# Altium footprint library IC.PCBLIB: 359 footprints (part 16 of 23)
Each footprint in its own frame and in the unit in brackets; x right, y up, seen from the top. Pads: shape width x height; smd on the part's side, far side on the other; paste and mask are expansions set on the pad; w line width, h text height; cw(c..) or ccw(c..) is an arc to the next point about the centre after c.
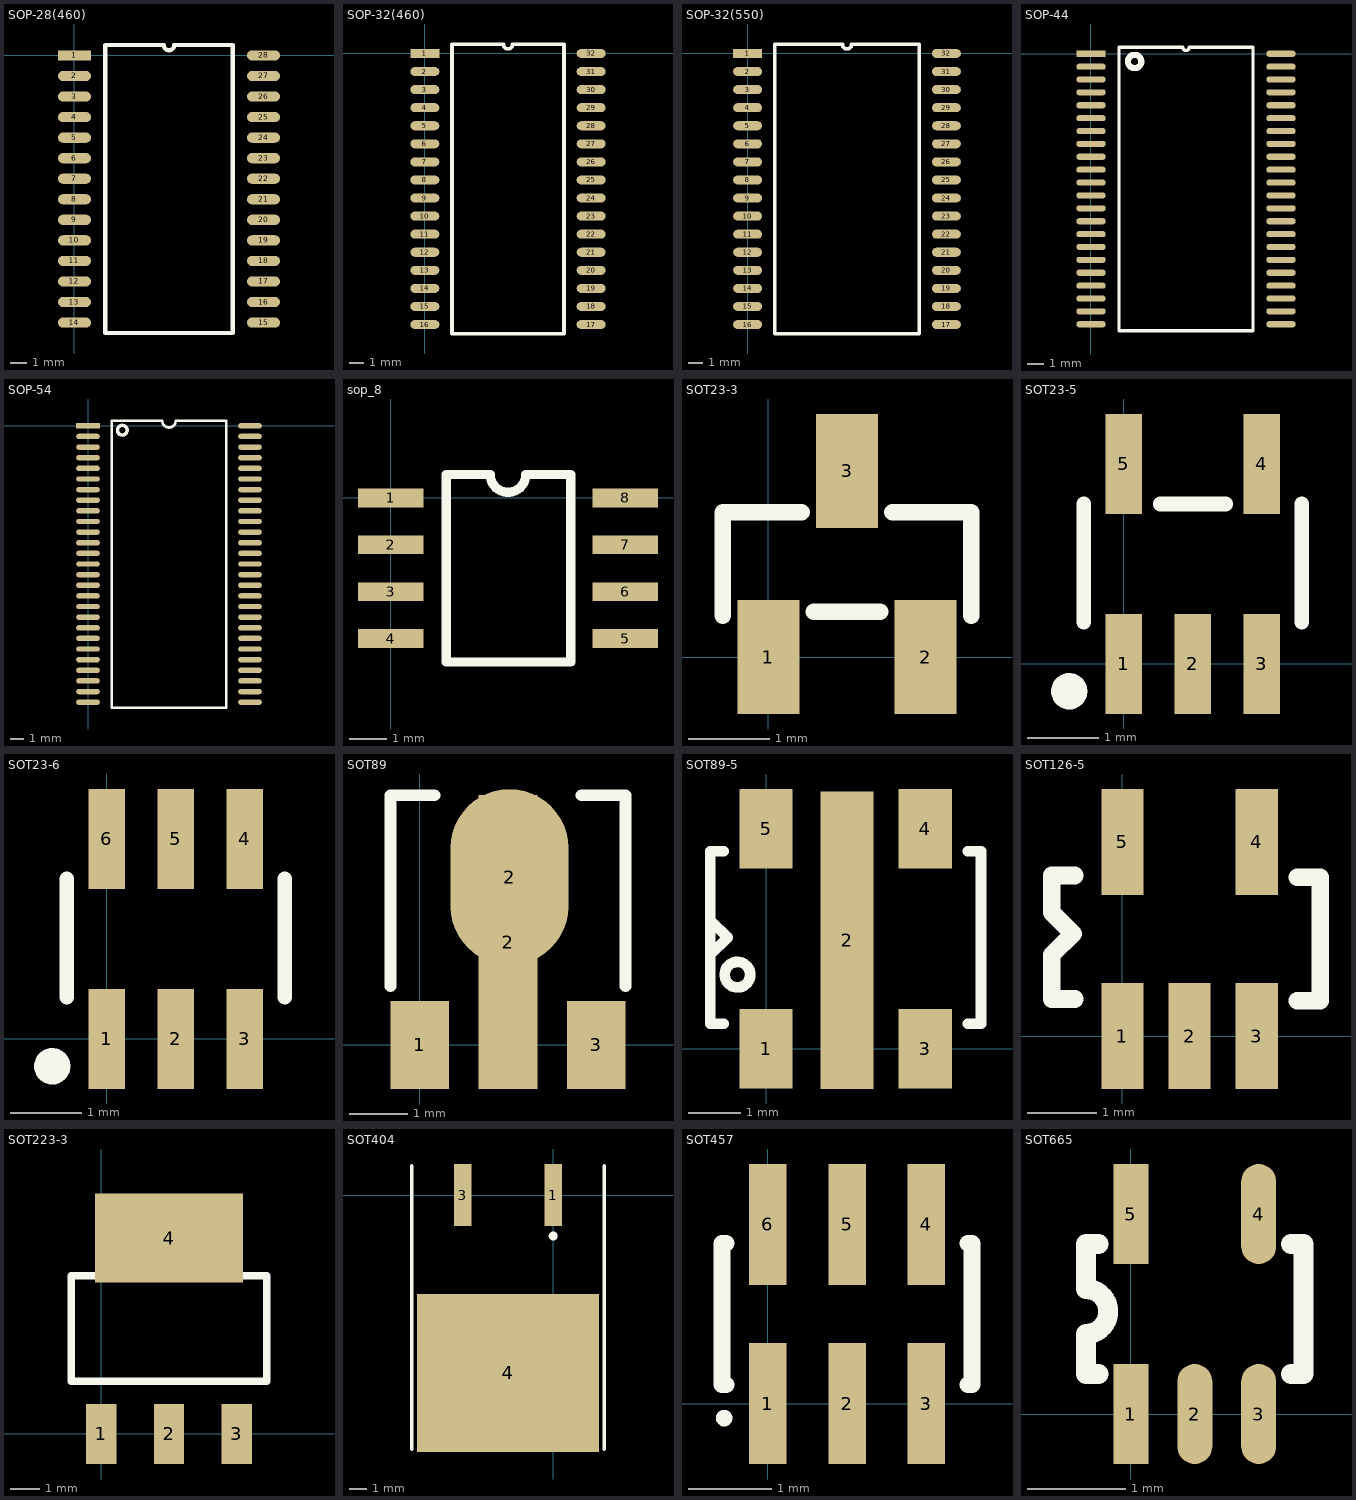
[diagram p15: the footprints below, top view; thin cyan lines are the x and y axes]

## SOP-28(460) [mil]
pads (28):
  rect 80x25 smd: 1(0,0)
  oval 80x25 smd: 2(0,-50) 3(0,-100) 4(0,-150) 5(0,-200) 6(0,-250) 7(0,-300) 8(0,-350) 9(0,-400) 10(0,-450) 11(0,-500) 12(0,-550) 13(0,-600) 14(0,-650) 15(460,-650) 16(460,-600) 17(460,-550) 18(460,-500) 19(460,-450) 20(460,-400) 21(460,-350) 22(460,-300) 23(460,-250) 24(460,-200) 25(460,-150) 26(460,-100) 27(460,-50) 28(460,0)
TopOverlay:
  lines w10: 75,-675 75,25 217.5,25 ccw(c230,25) 242.5,25 385,25 385,-675 75,-675

## SOP-32(460) [mil]
pads (32):
  rect 80x25 smd: 1(0,0)
  oval 80x25 smd: 2(0,-50) 3(0,-100) 4(0,-150) 5(0,-200) 6(0,-250) 7(0,-300) 8(0,-350) 9(0,-400) 10(0,-450) 11(0,-500) 12(0,-550) 13(0,-600) 14(0,-650) 15(0,-700) 16(0,-750) 17(460,-750) 18(460,-700) 19(460,-650) 20(460,-600) 21(460,-550) 22(460,-500) 23(460,-450) 24(460,-400) 25(460,-350) 26(460,-300) 27(460,-250) 28(460,-200) 29(460,-150) 30(460,-100) 31(460,-50) 32(460,0)
TopOverlay:
  lines w10: 75,-775 385,-775 385,25 242.5,25 cw(c230,25) 217.5,25 75,25 75,-775

## SOP-32(550) [mil]
pads (32):
  rect 80x25 smd: 1(0,0)
  oval 80x25 smd: 2(0,-50) 3(0,-100) 4(0,-150) 5(0,-200) 6(0,-250) 7(0,-300) 8(0,-350) 9(0,-400) 10(0,-450) 11(0,-500) 12(0,-550) 13(0,-600) 14(0,-650) 15(0,-700) 16(0,-750) 17(550,-750) 18(550,-700) 19(550,-650) 20(550,-600) 21(550,-550) 22(550,-500) 23(550,-450) 24(550,-400) 25(550,-350) 26(550,-300) 27(550,-250) 28(550,-200) 29(550,-150) 30(550,-100) 31(550,-50) 32(550,0)
TopOverlay:
  lines w10: 75,-775 475,-775 475,25 287.5,25 cw(c275,25) 262.5,25 75,25 75,-775

## SOP-44 [mil]
pads (44):
  rect 72x15 smd: 1(0,0)
  oval 72x15 smd: 2(0,-31.5) 3(0,-62.99) 4(0,-94.49) 5(0,-125.98) 6(0,-157.48) 7(0,-188.98) 8(0,-220.47) 9(0,-251.97) 10(0,-283.46) 11(0,-314.96) 12(0,-346.46) 13(0,-377.95) 14(0,-409.45) 15(0,-440.94) 16(0,-472.44) 17(0,-503.94) 18(0,-535.43) 19(0,-566.93) 20(0,-598.43) 21(0,-629.92) 22(0,-661.42) 23(464.57,-661.42) 24(464.57,-629.92) 25(464.57,-598.43) 26(464.57,-566.93) 27(464.57,-535.43) 28(464.57,-503.94) 29(464.57,-472.44) 30(464.57,-440.94) 31(464.57,-409.45) 32(464.57,-377.95) 33(464.57,-346.46) 34(464.57,-314.96) 35(464.57,-283.46) 36(464.57,-251.97) 37(464.57,-220.47) 38(464.57,-188.98) 39(464.57,-157.48) 40(464.57,-125.98) 41(464.57,-94.49) 42(464.57,-62.99) 43(464.57,-31.5) 44(464.57,0)
TopOverlay:
  lines w7.87: 68.31,-677.17 396.26,-677.17 396.26,15.75 240.16,15.75 cw(c232.28,15.75) 224.41,15.75 68.31,15.75 68.31,-677.17
  lines w15: 123,-19 cw(c106.69,-19) 122.99,-18.32

## SOP-54 [mil]
pads (54):
  rect 70x16 smd: 1(0,0)
  oval 70x16 smd: 2(0,-31.5) 3(0,-62.99) 4(0,-94.49) 5(0,-125.98) 6(0,-157.48) 7(0,-188.98) 8(0,-220.47) 9(0,-251.97) 10(0,-283.46) 11(0,-314.96) 12(0,-346.46) 13(0,-377.95) 14(0,-409.45) 15(0,-440.94) 16(0,-472.44) 17(0,-503.94) 18(0,-535.43) 19(0,-566.93) 20(0,-598.43) 21(0,-629.92) 22(0,-661.42) 23(0,-692.91) 24(0,-724.41) 25(0,-755.91) 26(0,-787.4) 27(0,-818.9) 28(479.94,-818.9) 29(479.94,-787.4) 30(479.94,-755.91) 31(479.94,-724.41) 32(479.94,-692.91) 33(479.94,-661.42) 34(479.94,-629.92) 35(479.94,-598.43) 36(479.94,-566.93) 37(479.94,-535.43) 38(479.94,-503.94) 39(479.94,-472.44) 40(479.94,-440.94) 41(479.94,-409.45) 42(479.94,-377.95) 43(479.94,-346.46) 44(479.94,-314.96) 45(479.94,-283.46) 46(479.94,-251.97) 47(479.94,-220.47) 48(479.94,-188.98) 49(479.94,-157.48) 50(479.94,-125.98) 51(479.94,-94.49) 52(479.94,-62.99) 53(479.94,-31.5) 54(479.94,0)
TopOverlay:
  circle w10: c101.58,-13 r14.42
  lines w7.87: 70,-835 410,-835 ; 70,15 220,15 ccw(c240,15) 260,15 410,15
  lines w8: 70,-835 70,15 ; 410,-835 410,15

## sop_8 [mil]
pads (8):
  rect 70x20 smd: 1(0,0) 2(0,-50) 3(0,-100) 4(0,-150) 5(250,-150) 6(250,-100) 7(250,-50) 8(250,0)
TopOverlay:
  lines w10: 144,25 cw(c125,25) 106,25 59,25 59,-175 192,-175 192,25 145,25
3D body: height 80, standoff 10, extent 56,-176 192,27

## SOT23-3 [mil]
pads (3):
  rect 30x55 smd: 1(0,0) 2(76,0) 3(38,90)
TopOverlay:
  lines w8: -22,20 -22,70 16,70 ; 22,22 54,22 ; 60,70 98,70 98,20

## SOT23-5 [mil]
pads (5):
  rect 20x55 smd: 1(0,0) 2(38,0) 3(76,0) 4(76,110) 5(0,110)
TopOverlay:
  circle w10: c-30,-15 r5
  lines w8: -22,23 -22,88 ; 20,88 56,88 ; 98,23 98,88

## SOT23-6 [mil]
pads (6):
  rect 20x55 smd: 1(0,0) 2(38,0) 3(76,0) 4(76,110) 5(38,110) 6(0,110)
TopOverlay:
  circle w10: c-30,-15 r5
  lines w8: -22,23 -22,88 ; 98,23 98,88

## SOT89 [mil]
pads (4):
  rect 40x60 smd: 1(0,0) 3(120,0)
  rect 40x200 smd: 2(60,70)
  oval 80x120 smd: 2(61.02,114.17)
TopOverlay:
  lines w8: -20,40 -20,170 10,170 ; 110,170 140,170 140,40

## SOT89-5 [mil]
pads (5):
  rect 40x60 smd: 1(0,0) 3(120,0) 4(120,166) 5(0,166)
  rect 40x224.41 smd: 2(61,82)
TopOverlay:
  circle w8: c-21.61,56 r9.62
  lines w8: -42,71 -29,84 -42,97 ; -32,19 -42,19 -42,149 -32,149 ; 152,19 162,19 162,149 152,149

## SOT126-5 [mil]
pads (5):
  rect 24x60 smd: 1(0,0) 2(38,0) 3(76,0) 4(76,110) 5(0,110)
TopOverlay:
  lines w10: -27,21 -40,21 -40,46 -28,58 -40,70 -40,91 -27,91 ; 99,20 112,20 112,90 99,90

## SOT223-3 [mil]
pads (4):
  rect 40x80 smd: 1(0,0) 2(90,0) 3(180,0)
  rect 196.85x118.11 smd: 4(90,260)
TopOverlay:
  lines w10: -40,70 220,70 220,210 -40,210 -40,70

## SOT404 [mm]
pads (3):
  rect 1x3.5 smd: 1(0,0) 3(-5.08,0)
  rect 10.25x8.9 smd: 4(-2.54,-9.998)
TopOverlay:
  circle w0.25: c0,-2.3 r0.125
  lines w0.2: -7.965,-14.3 -7.965,1.65 ; 2.885,-14.3 2.885,1.65

## SOT457 [mm]
pads (6):
  rect 0.45x1.45 smd: 1(0,0) 2(0.95,0) 3(1.9,0) 4(1.9,2.15) 5(0.95,2.15) 6(0,2.15)
TopOverlay:
  circle w0.1: c-0.525,-0.175 r0.05
  lines w0.2: -0.5,0.225 -0.55,0.225 -0.55,1.925 -0.5,1.925 ; 2.4,0.225 2.45,0.225 2.45,1.925 2.4,1.925

## SOT665 [mil]
pads (5):
  rect 14x40 smd: 1(0,0) 5(0,80)
  oval 14x40 smd: 2(25.59,0) 3(51.18,0) 4(51.18,80)
TopOverlay:
  lines w8: -13,16 -18,16 -18,32 ccw(c-18,41) -18,50 -18,68 -13,68 ; 64,16 69,16 69,68 64,68